# Altium integrated library BYTECH_HW_LIB_2019.IntLib: 907 symbols (part 1 of 6) (continued)
## ESP32-WROOM-32U (continued)
text: ONLY FOR; MEMORY

## ESP32-WROVER-B
designator U?
SMD MODULE ESP32-WROVER-B, ESP32; MFR: Espressif; Solder: SMT; Category: MODULE; MPN: ESP32-WROVER-B; PinCount: 39; Value: ESP32-WROVER-B
footprint ESP32-WROVER
pins: 1 GND (power) "Ground", 2 3V3 (power) "Power supply", 3 EN (in) "Module-enable signal. Active high.", 4 SENSOR_VP (in) "GPIO36, ADC1_CH0, RTC_GPIO0", 5 SENSOR_VN (in) "GPIO39, ADC1_CH3, RTC_GPIO3", 6 IO34 (in) "GPIO34, ADC1_CH6, RTC_GPIO4", 7 IO35 (in) "GPIO35, ADC1_CH7, RTC_GPIO5", 8 IO32 (io) "GPIO32, XTAL_32K_P, ADC1_CH4, TOUCH9, RTC_GPIO9", 9 IO33 (io) "GPIO33, XTAL_32K_N, ADC1_CH5,TOUCH8, RTC_GPIO8", 10 IO25 (io) "GPIO25, DAC_1, ADC2_CH8, RTC_GPIO6, EMAC_RXD0", 11 IO26 (io) "GPIO26, DAC_2, ADC2_CH9, RTC_GPIO7, EMAC_RXD1", 12 IO27 (io) "GPIO27, ADC2_CH7, TOUCH7, RTC_GPIO17, EMAC_RX_DV", 13 IO14 (io) "GPIO14, ADC2_CH6, TOUCH6, RTC_GPIO16, MTMS, HSPICLK, HS2_CLK, SD_CLK, EMAC_TXD2", 14 IO12 (io) "GPIO12, ADC2_CH5, TOUCH5, RTC_GPIO15, MTDI, HSPIQ, HS2_DATA2, SD_DATA2, EMAC_TXD3", 15 GND (power) "Ground", 16 IO13 (io) "GPIO13, ADC2_CH4, TOUCH4, RTC_GPIO14, MTCK, HSPID, HS2_DATA3,SD_DATA3, EMAC_RX_ER", 17 SHD/SD2* (io) "GPIO9, SD_DATA2, SPIHD, HS1_DATA2, U1RXD", 18 SWP/SD3* (io) "GPIO10, SD_DATA3, SPIWP, HS1_DATA3, U1TXD", 19 SCS/CMD* (io) "GPIO11, SD_CMD, SPICS0, HS1_CMD, U1RTS", 20 SCK/CLK* (io) "GPIO6, SD_CLK, SPICLK, HS1_CLK, U1CTS", 21 SDO/SD0* (io) "GPIO7, SD_DATA0, SPIQ, HS1_DATA0, U2RTS", 22 SDI/SD1* (io) "GPIO8, SD_DATA1, SPID, HS1_DATA1, U2CTS", 23 IO15 (io) "GPIO15, ADC2_CH3, TOUCH3, MTDO, HSPICS0, RTC_GPIO13, HS2_CMD,SD_CMD, EMAC_RXD3", 24 IO2 (io) "GPIO2, ADC2_CH2, TOUCH2, RTC_GPIO12, HSPIWP, HS2_DATA0,SD_DATA0", 25 IO0 (io) "GPIO0, ADC2_CH1, TOUCH1, RTC_GPIO11, CLK_OUT1, EMAC_TX_CLK", 26 IO4 (io) "GPIO4, ADC2_CH0, TOUCH0, RTC_GPIO10, HSPIHD, HS2_DATA1,SD_DATA1, EMAC_TX_ER", 27 NC "GPIO16, HS1_DATA4, U2RXD, EMAC_CLK_OUT", 28 NC "GPIO17, HS1_DATA5, U2TXD, EMAC_CLK_OUT_180", 29 IO5 (io) "GPIO5, VSPICS0, HS1_DATA6, EMAC_RX_CLK", 30 IO18 (io) "GPIO18, VSPICLK, HS1_DATA7", 31 IO19 (io) "GPIO19, VSPIQ, U0CTS, EMAC_TXD0", 32 NC, 33 IO21 (io) "GPIO21, VSPIHD, EMAC_TX_EN", 34 RXD0 (io) "GPIO3, U0RXD, CLK_OUT2", 35 TXD0 (io) "GPIO1, U0TXD, CLK_OUT3, EMAC_RXD2", 36 IO22 (io) "GPIO22, VSPIWP, U0RTS, EMAC_TXD1", 37 IO23 (io) "GPIO23, VSPID, HS1_STROBE", 38 GND (power) "Ground", 39 TP (power)
text: ONLY FOR; MEMORY

## ESP-01
designator M?
MFR: Espressif; MPN: ESP-01; Solder: WAVE; Value: ESP-01; Category: MODULE; PinCount: 8
footprint ESP-01&01S Module
pins: 1 RX, 2 IO0, 3 IO2, 4 GND, 5 VDD, 6 RST, 7 EN, 8 TX

## ESP-01M
designator M?
MFR: Espressif; MPN: ESP-01M; Solder: SMT; Value: ESP-01M; Category: MODULE; PinCount: 18
footprint ESP-01M
pins: 1 GND, 2 VDD, 3 TXD0, 4 RXD0, 5 GPIO13, 6 GPIO15, 7 GPIO2, 8 GPIO0, 9 EN, 10 GPIO4, 11 GPIO9, 12 GPIO10, 13 GPIO5, 14 GPIO12, 15 GPIO14, 16 ADC, 17 GPIO16, 18 RST

## ESP-01S
designator M?
MFR: Espressif; MPN: ESP-01S; Solder: WAVE; Value: ESP-01S; Category: MODULE; PinCount: 8
footprint ESP-01&01S Module
pins: 1 RX, 2 IO0, 3 IO2, 4 GND, 5 VDD, 6 RST, 7 EN, 8 TX

## ESP-07
designator M?
ESP-07 Module; MFR: Espressif; Solder: SMT; Category: MODULE; MPN: ESP-07; PinCount: 16; Value: ESP-07
footprint ESP-07 Module
pins: 1 RST, 2 ADC, 3 EN, 4 GPIO16, 5 GPIO14, 6 GPIO12, 7 GPIO13, 8 VCC, 9 GND, 10 GPIO15, 11 GPIO2, 12 GPIO0, 13 GPIO4, 14 GPIO5, 15 RXD0, 16 TXD0

## ESP-07S
designator M?
ESP-07S Module; MFR: Espressif; Solder: SMT; Category: MODULE; MPN: ESP-07S; PinCount: 16; Value: ESP-07S
footprint ESP-07S Module
pins: 0 GND, 1 RST, 2 ADC, 3 EN, 4 GPIO16, 5 GPIO14, 6 GPIO12, 7 GPIO13, 8 VCC, 9 GND, 10 GPIO15, 11 GPIO2, 12 GPIO0, 13 GPIO4, 14 GPIO5, 15 RXD0, 16 TXD0

## ESP-12E
designator M?
ESP-12E Module; MFR: Espressif; Solder: SMT; Category: MODULE; MPN: ESP-12E; PinCount: 22; Value: ESP-12E
footprint ESP-12E&F Module
pins: 1 RST, 2 ADC, 3 EN, 4 GPIO16, 5 GPIO14, 6 GPIO12, 7 GPIO13, 8 VCC, 9 CS0, 10 MISO, 11 GPIO9, 12 GPIO10, 13 MOSI, 14 SCLK, 15 GND, 16 GPIO15, 17 GPIO2, 18 GPIO0, 19 GPIO4, 20 GPIO5, 21 RXD0, 22 TXD0

## ESP-12F
designator M?
ESP-12F Module; MFR: Espressif; Solder: SMT; Category: MODULE; MPN: ESP-12F; PinCount: 22; Value: ESP-12F
footprint ESP-12E&F Module
pins: 1 RST, 2 ADC, 3 EN, 4 GPIO16, 5 GPIO14, 6 GPIO12, 7 GPIO13, 8 VCC, 9 CS0, 10 MISO, 11 GPIO9, 12 GPIO10, 13 MOSI, 14 SCLK, 15 GND, 16 GPIO15, 17 GPIO2, 18 GPIO0, 19 GPIO4, 20 GPIO5, 21 RXD0, 22 TXD0

## ESP-12S
designator U?
ESP-12S Module; MFR: Espressif; Solder: SMT; Category: MODULE; MPN: ESP-12S; PinCount: 16; Value: ESP-12S
footprint ESP-12S Module
pins: 0 GND, 1 RST, 2 ADC, 3 EN, 4 GPIO16, 5 GPIO14, 6 GPIO12, 7 GPIO13, 8 VCC, 9 GND, 10 GPIO15, 11 GPIO2, 12 GPIO0, 13 GPIO4, 14 GPIO5, 15 RXD0, 16 TXD0

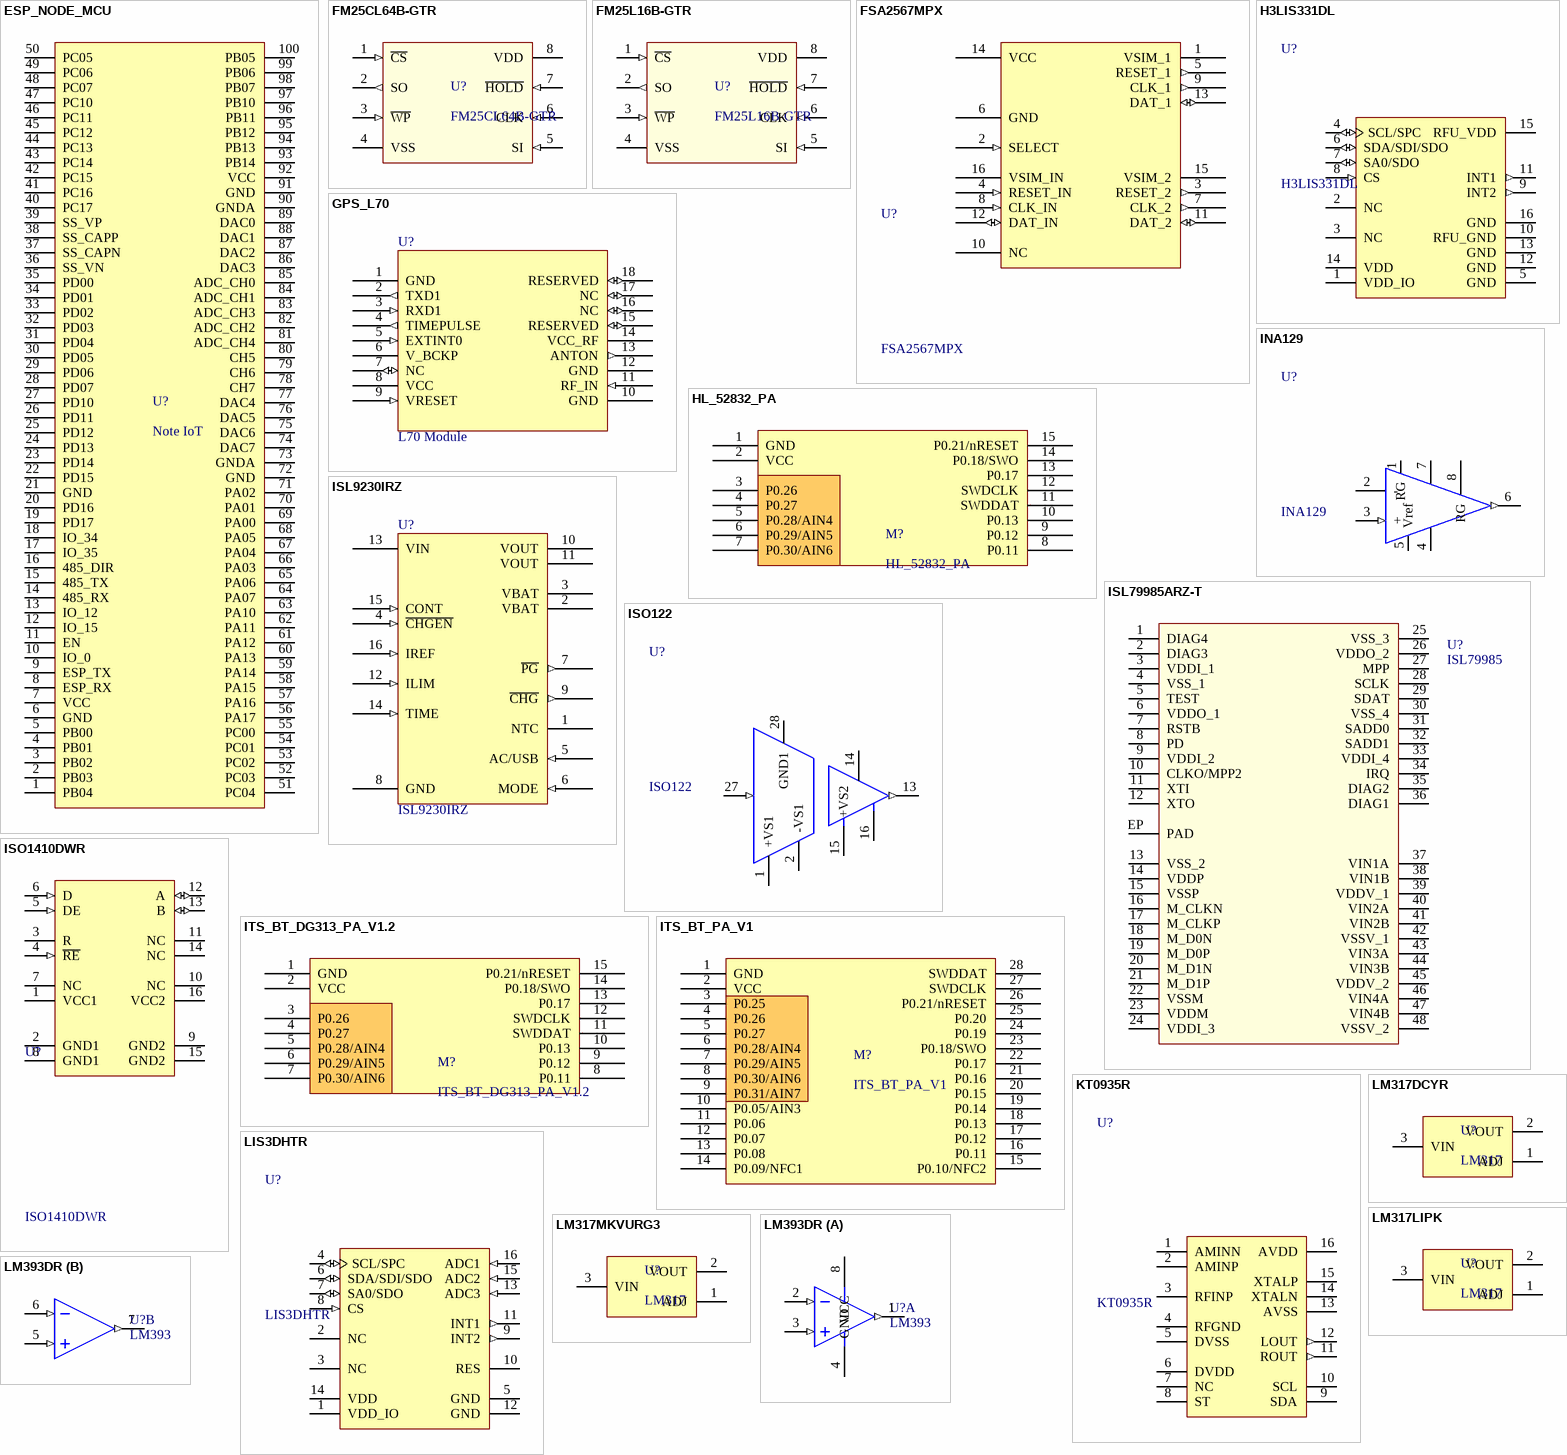
[diagram p4: symbols ESP_NODE_MCU to LM393DR]

## ESP_NODE_MCU
designator U?, comment Note IoT
PINOUT FOR NODE IOT; Project: TPA_IoT; Designer: Butpt; Value: Note IoT
footprint NODE_IOT
pins: 1 PB04, 2 PB03, 3 PB02, 4 PB01, 5 PB00, 6 GND, 7 VCC, 8 ESP_RX, 9 ESP_TX, 10 IO_0, 11 EN, 12 IO_15, 13 IO_12, 14 485_RX, 15 485_TX, 16 485_DIR, 17 IO_35, 18 IO_34, 19 PD17, 20 PD16, 21 GND, 22 PD15, 23 PD14, 24 PD13, 25 PD12, 26 PD11, 27 PD10, 28 PD07, 29 PD06, 30 PD05, 31 PD04, 32 PD03, 33 PD02, 34 PD01, 35 PD00, 36 SS_VN, 37 SS_CAPN, 38 SS_CAPP, 39 SS_VP, 40 PC17, 41 PC16, 42 PC15, 43 PC14, 44 PC13, 45 PC12, 46 PC11, 47 PC10, 48 PC07, 49 PC06, 50 PC05, 51 PC04, 52 PC03, 53 PC02, 54 PC01, 55 PC00, 56 PA17, 57 PA16, 58 PA15, 59 PA14, 60 PA13, 61 PA12, 62 PA11, 63 PA10, 64 PA07, 65 PA06, 66 PA03, 67 PA04, 68 PA05, 69 PA00, 70 PA01, 71 PA02, 72 GND, 73 GNDA, 74 DAC7, 75 DAC6, 76 DAC5, 77 DAC4, 78 CH7, 79 CH6, 80 CH5, 81 ADC_CH4, 82 ADC_CH2, 83 ADC_CH3, 84 ADC_CH1, 85 ADC_CH0, 86 DAC3, 87 DAC2, 88 DAC1, 89 DAC0, 90 GNDA, 91 GND, 92 VCC, 93 PB14, 94 PB13, 95 PB12, 96 PB11, 97 PB10, 98 PB07, 99 PB06, 100 PB05

## FM25CL64B-GTR
designator U?
IC FRAM 64KBIT 20MHz SOIC-8; Solder: SMT; MPN: FM25CL64B-GTR; Value: FM25CL64B-GTR; Category: IC; PinCount: 8
footprint SOIC-8
pins: 1 ~{CS} (in), 2 SO (out), 3 ~{WP} (in), 4 VSS (power), 5 SI (in), 6 CLK (in), 7 ~{HOLD} (in), 8 VDD (power)

## FM25L16B-GTR
designator U?
IC FRAM 16KBIT 20MHz SOIC-8; Solder: SMT; MPN: FM25L16B-GTR; Value: FM25L16B-GTR; Category: IC; PinCount: 8
footprint SOIC-8
pins: 1 ~{CS} (in), 2 SO (out), 3 ~{WP} (in), 4 VSS (power), 5 SI (in), 6 CLK (in), 7 ~{HOLD} (in), 8 VDD (power)

## FSA2567MPX
designator U?
IC SWITCH 4PDT 16MLP; MFR: ON Semiconductor; Solder: SMT; MPN: FSA2567MPX; Value: FSA2567MPX; Category: IC; PinCount: 16
footprint QFN16 30X30 (QFN, 16-Leads, Body 3.00x3.00mm, Pitch 0.50mm, Thermal Pad 1.70x1.70mm, IPC Medium Density)
pins: 1 VSIM_1 (power), 2 SELECT (in), 3 RESET_2 (out), 4 RESET_IN (in), 5 RESET_1 (out), 6 GND (power), 7 CLK_2 (out), 8 CLK_IN (in), 9 CLK_1 (out), 10 NC (hiz), 11 DAT_2 (io), 12 DAT_IN (io), 13 DAT_1 (io), 14 VCC (power), 15 VSIM_2 (power), 16 VSIM_IN (power)

## GPS_L70
designator U?, comment L70 Module
L70 GPS module; Solder: SMT; Value: L70B; MPN: L70B; Category: MODULE
footprint GPS.L70
pins: 1 GND (power), 2 TXD1 (out), 3 RXD1 (in), 4 TIMEPULSE (out), 5 EXTINT0 (in), 6 V_BCKP (power), 7 NC (io), 8 VCC (power), 9 VRESET (in), 10 GND (power), 11 RF_IN (in), 12 GND (power), 13 ANTON (out), 14 VCC_RF (power), 15 RESERVED (io), 16 NC (io), 17 NC (io), 18 RESERVED (io)

## H3LIS331DL
designator U?
ACCEL 100-400G I2C/SPI 16TFLGA; MFR: STMicroelectronics; Solder: SMT; MPN: H3LIS331DL; Value: H3LIS331DL; Category: IC; PinCount: 16
footprint STM-LGA-16_N (Footprint not found)
pins: 1 VDD_IO (power) "Power supply for I/O pins", 2 NC "Not connected", 3 NC "Not connected", 4 SCL/SPC (io) "I2C serial clock (SCL),SPI serial port clock (SPC)", 5 GND (power) "0V supply", 6 SDA/SDI/SDO (io) "I2C serial data (SDA),SPI serial data input (SDI),3-wire interface serial data output (SDO)", 7 SA0/SDO (io) "SPI serial data output (SDO),I2C less significant bit of the device address (SA0)", 8 CS (in) "SPI enable I2C/SPI mode selection (1: I2C mode; 0: SPI enabled)", 9 INT2 (out) "Inertial interrupt 2", 10 RFU_GND (power) "Connect to GND", 11 INT1 (out) "Inertial interrupt 1", 12 GND (power) "0 V supply", 13 GND (power) "Analog to digital converter input 3", 14 VDD (power) "Power supply", 15 RFU_VDD (power), 16 GND (power) "Analog to digital converter input 1"

## HL_52832_PA
designator M?
Solder: SMT; MPN: HL_52832_PA; Value: HL_52832_PA; Category: MODULE
footprint HL_52832_PA
pins: 1 GND, 2 VCC, 3 P0.26, 4 P0.27, 5 P0.28/AIN4, 6 P0.29/AIN5, 7 P0.30/AIN6, 8 P0.11, 9 P0.12, 10 P0.13, 11 SWDDAT, 12 SWDCLK, 13 P0.17, 14 P0.18/SWO, 15 P0.21/nRESET

## INA129
designator U?
IC INST AMP 1 CIRCUIT 8SOIC; MPN: INA129UA/2K5; MFR: TI; Solder: SMT; Value: INA129; Category: IC; PinCount: 8
footprint SOIC-8
pins: 1 RG, 2 -, 3 + (in), 4 V-, 5 Vref, 6 Vout (out), 7 V+, 8 RG

## ISL9230IRZ
designator U?
IC BATT CHRGR LIION 1CELL 16TQFN; Solder: SMT; MPN: ISL9230IRZ; Value: ISL9230IRZ; Category: IC
footprint VFQFN-16 (16-VFQFN Exposed Pad)
pins: 1 NTC, 2 VBAT (power), 3 VBAT (power), 4 ~{CHGEN} (in), 5 AC/USB (in), 6 MODE (in), 7 ~{PG} (out), 8 GND (power), 9 ~{CHG} (out), 10 VOUT (power), 11 VOUT (power), 12 ILIM (in), 13 VIN (power), 14 TIME (in), 15 CONT (in), 16 IREF (in)

## ISL79985ARZ-T
designator U?, comment ISL79985
ISL79985 AUTO GRADE 4CH ANALOG; MPN: ISL79985ARZ-T; Solder: SMT; CPN: *; Value: ISL79985; Category: IC
pins: 1 DIAG4, 2 DIAG3, 3 VDDI_1, 4 VSS_1, 5 TEST, 6 VDDO_1, 7 RSTB, 8 PD, 9 VDDI_2, 10 CLKO/MPP2, 11 XTI, 12 XTO, 13 VSS_2, 14 VDDP, 15 VSSP, 16 M_CLKN, 17 M_CLKP, 18 M_D0N, 19 M_D0P, 20 M_D1N, 21 M_D1P, 22 VSSM, 23 VDDM, 24 VDDI_3, 25 VSS_3, 26 VDDO_2, 27 MPP, 28 SCLK, 29 SDAT, 30 VSS_4, 31 SADD0, 32 SADD1, 33 VDDI_4, 34 IRQ, 35 DIAG2, 36 DIAG1, 37 VIN1A, 38 VIN1B, 39 VDDV_1, 40 VIN2A, 41 VIN2B, 42 VSSV_1, 43 VIN3A, 44 VIN3B, 45 VDDV_2, 46 VIN4A, 47 VIN4B, 48 VSSV_2, EP PAD

## ISO122
designator U?
IC OPAMP ISOLATION 1 CIRC 8SOIC; MPN: ISO122JU/1K; MFR: TI; Solder: SMT; Value: ISO122; Category: IC; PinCount: 8
footprint ISO122 (SOT23, 3-Leads, Body 2,90x2,30mm, Pitch 0,95mm, IPC Medium Density)
pins: 1 +VS1 (power), 2 -VS1 (power), 13 OUT (out), 14 GND2 (power), 15 +VS2 (power), 16 -VS2 (power), 27 IN (in), 28 GND1 (power)

## ISO1410DWR
designator U?
IC TRANSCEIVER HALF 1/1 16SOIC; Solder: SMT; MPN: ISO1410DWR; Value: ISO1410DWR; Category: IC
footprint DW16_N (SOIC, 16-Leads, Body 10.3x7.5mm, Pitch 1.27mm, IPC Medium Density)
pins: 1 VCC1 (power), 2 GND1 (power), 3 R (hiz), 4 ~{RE} (in), 5 DE (in), 6 D (in), 7 NC (power), 8 GND1 (power), 9 GND2 (power), 10 NC (power), 11 NC, 12 A (io), 13 B (io), 14 NC, 15 GND2 (power), 16 VCC2 (power)

## ITS_BT_DG313_PA_V1.2
designator M?
MFR: BY TECH JSC; Solder: SMT; MPN: ITS_BT_DG313_PA_V1.2; Value: ITS_BT_DG313_PA_V1.2; Category: MODULE; PinCount: 15
footprint ITS_BT_DG313_PA_V1.2 (Footprint not found)
pins: 1 GND, 2 VCC, 3 P0.26, 4 P0.27, 5 P0.28/AIN4, 6 P0.29/AIN5, 7 P0.30/AIN6, 8 P0.11, 9 P0.12, 10 P0.13, 11 SWDDAT, 12 SWDCLK, 13 P0.17, 14 P0.18/SWO, 15 P0.21/nRESET

## ITS_BT_PA_V1
designator M?
Solder: SMT; MPN: ITS_BT_PA_V1; Value: ITS_BT_PA_V1; Category: MODULE
footprint ITS-BT-PA-V1
pins: 1 GND, 2 VCC, 3 P0.25, 4 P0.26, 5 P0.27, 6 P0.28/AIN4, 7 P0.29/AIN5, 8 P0.30/AIN6, 9 P0.31/AIN7, 10 P0.05/AIN3, 11 P0.06, 12 P0.07, 13 P0.08, 14 P0.09/NFC1, 15 P0.10/NFC2, 16 P0.11, 17 P0.12, 18 P0.13, 19 P0.14, 20 P0.15, 21 P0.16, 22 P0.17, 23 P0.18/SWO, 24 P0.19, 25 P0.20, 26 P0.21/nRESET, 27 SWDCLK, 28 SWDDAT

## KT0935R
designator U?
RF RX AM/FM RECEIVER; Solder: SMT; Value: KT0935R; MPN: KT0935R; Category: IC
footprint KT0935R (Small Outline IC (SOIC), 1.27 mm pitch; 16 pin, 9.90 mm L X 4.00 mm W X 1.75 mm H body)
pins: 1 AMINN, 2 AMINP, 3 RFINP, 4 RFGND, 5 DVSS, 6 DVDD, 7 NC, 8 ST, 9 SDA, 10 SCL, 11 ROUT (out), 12 LOUT (out), 13 AVSS, 14 XTALN, 15 XTALP, 16 AVDD

## LIS3DHTR
designator U?
ACCEL 2-16G I2C/SPI 16LGA; MFR: STMicroelectronics; Solder: SMT; MPN: LIS3DHTR; Value: LIS3DHTR; Category: IC; PinCount: 16
footprint STM-LGA-16_N (Footprint not found)
pins: 1 VDD_IO (power) "Power supply for I/O pins", 2 NC "Not connected", 3 NC "Not connected", 4 SCL/SPC (io) "I2C serial clock (SCL),SPI serial port clock (SPC)", 5 GND (power) "0V supply", 6 SDA/SDI/SDO (io) "I2C serial data (SDA),SPI serial data input (SDI),3-wire interface serial data output (SDO)", 7 SA0/SDO (io) "SPI serial data output (SDO),I2C less significant bit of the device address (SA0)", 8 CS (in) "SPI enable I2C/SPI mode selection (1: I2C mode; 0: SPI enabled)", 9 INT2 (out) "Inertial interrupt 2", 10 RES (power) "Connect to GND", 11 INT1 (out) "Inertial interrupt 1", 12 GND (power) "0 V supply", 13 ADC3 (in) "Analog to digital converter input 3", 14 VDD (power) "Power supply", 15 ADC2 (in) "Analog to digital converter input 2", 16 ADC1 (in) "Analog to digital converter input 1"

## LM317DCYR
designator U?, comment LM317
IC REG LIN POS ADJ 1.5A SOT223-4; MPN: LM317DCYR; Solder: SMT; Value: LM317; Category: IC
footprint SOT-223-4
pins: 1 ADJ, 2 VOUT, 3 VIN

## LM317LIPK
designator U?, comment LM317
IC REG LIN POS ADJ 100MA SOT89-3; MPN: LM317LIPK; Solder: SMT; Value: LM317; Category: IC
footprint SOT89-150P350X160-3M (SOT89, 3-Leads, Body 4.50x2.50mm, Pitch 1.50mm, Lead Span 3.5mm, IPC Low Density)
pins: 1 ADJ, 2 VOUT, 3 VIN

## LM317MKVURG3
designator U?, comment LM317
IC REG LIN POS ADJ 500MA TO252-3; MPN: LM317MKVURG3; Solder: SMT; Value: LM317; Category: IC
footprint TO-252-3
pins: 1 ADJ, 2 VOUT, 3 VIN

## LM393DR
designator U?, comment LM393
IC DUAL DIFF COMP 8-SOIC; MPN: LM393DR; Solder: SMT; Value: LM393; Category: IC
footprint SOIC-8
part A pins: 1 OUT (out), 2 IN- (in), 3 IN+ (in), 4 GND (power), 8 VCC (power)
part B pins: 5 IN+ (in), 6 IN- (in), 7 OUT (out)

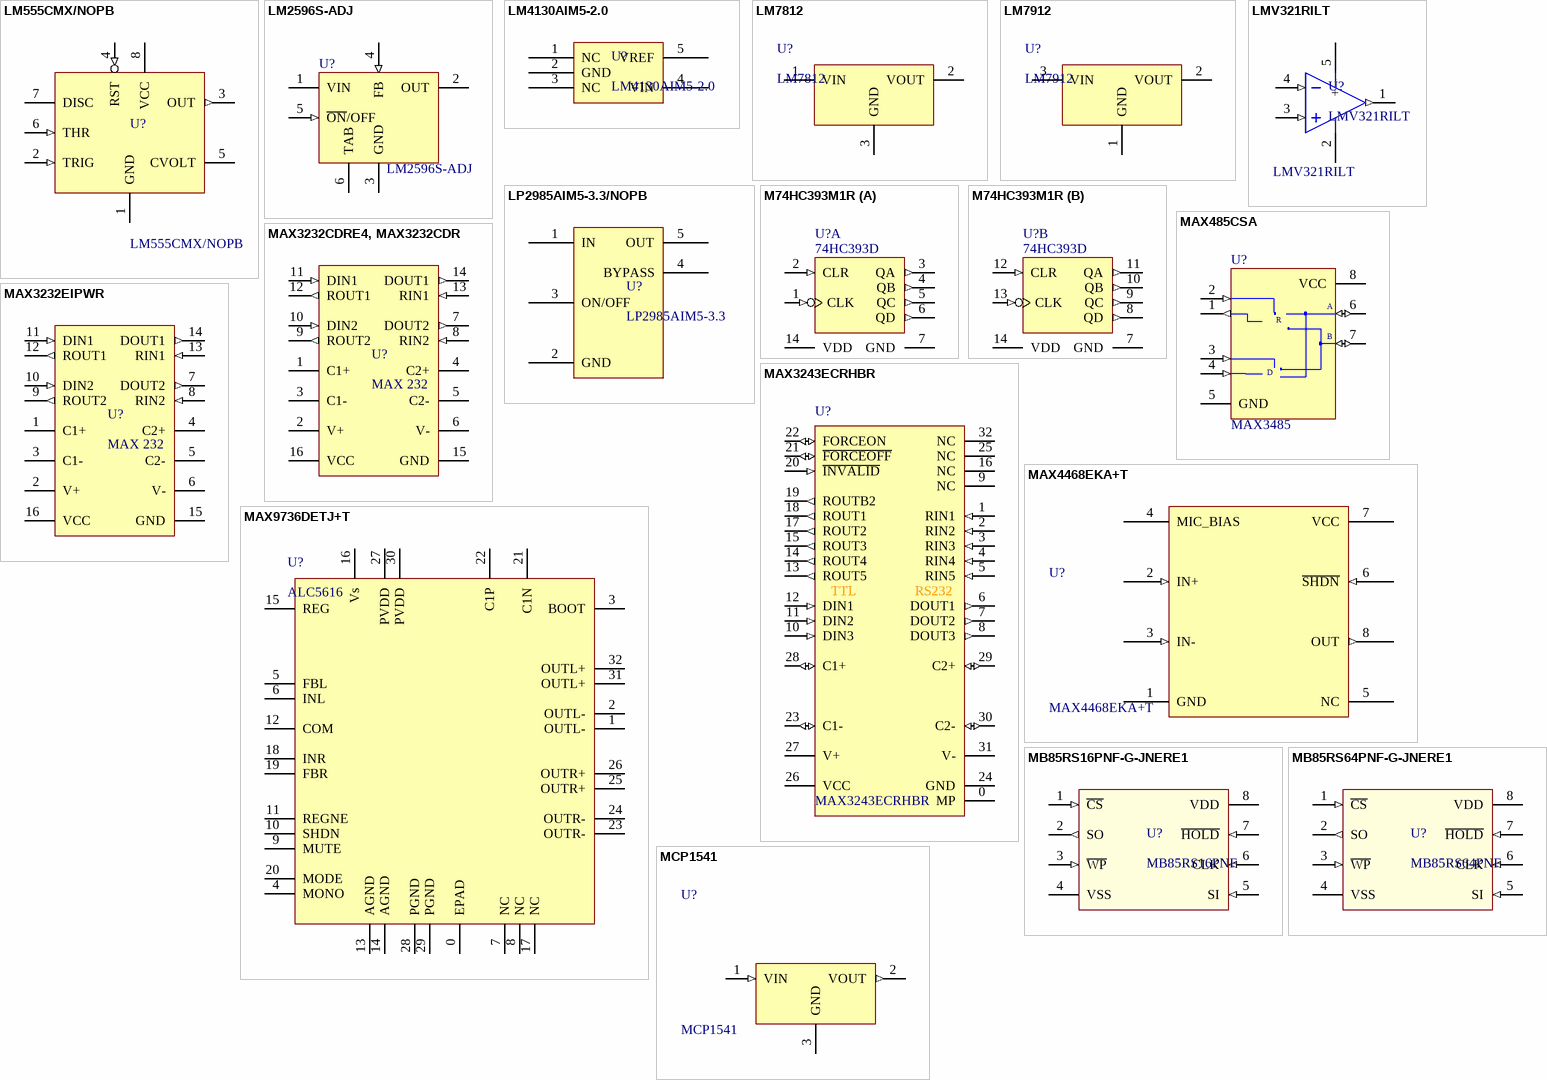
[diagram p5: symbols LM555CMX/NOPB to MCP1541]

## LM555CMX/NOPB
designator U?
IC OSC SGL TIMER 100KHZ 8-SOIC; Solder: SMT; MPN: LM555CMX/NOPB; Value: LM555CMX/NOPB; Category: IC
footprint SOIC-8
pins: 1 GND (power), 2 TRIG (in), 3 OUT (out), 4 RST (in), 5 CVOLT, 6 THR (in), 7 DISC (oc), 8 VCC (power)

## LM2596S-ADJ
designator U?
SIMPLE SWITCHER Power Converter 150 KHz 3A Step-Down Voltage Regulator; MPN: LM2596SX-ADJ/NOPB; Solder: SMT; Value: LM2596S-ADJ; Category: IC
footprint TS5B_L (D2-PAK, 6-Leads, Body 8.6x10.2mm, Pitch 1.7mm, Lead Span 14.1mm, IPC High Density)
footprint TS5B_M (D2-PAK, 6-Leads, Body 8.6x10.2mm, Pitch 1.7mm, Lead Span 14.1mm, IPC Low Density)
footprint TS5B_M (D2-PAK, 6-Leads, Body 8.6x10.2mm, Pitch 1.7mm, Lead Span 14.1mm, IPC Low Density)
footprint TO263-5 (LM2576-SMD)
pins: 1 VIN (power), 2 OUT (power), 3 GND (power), 4 FB (in), 5 ~{ON}/OFF (in), 6 TAB (power)

## LM4130AIM5-2.0
designator U?
Solder: SMT; MPN: LM4130AIM5-2.0; Value: LM4130AIM5-2.0; Category: IC
footprint SOT23-5
pins: 1 NC, 2 GND, 3 NC, 4 VIN, 5 VREF

## LM7812
designator U?
IC REG LINEAR 12V 1.5A D2PAK; MPN: L7812CD2T-TR; MFR: STM; Solder: SMT; Value: LM7812; Category: IC; PinCount: 3
footprint TO263_3 (DPAK, 5.08 mm pitch; 2 pin, 9.08 mm L X 10.16 mm W X 4.80 mm H body)
pins: 1 VIN, 2 VOUT, 3 GND

## LM7912
designator U?
IC REG LINEAR -12V 1.5A D2PAK; MPN: L7912CD2T-TR; MFR: STM; Solder: SMT; Value: LM7912; Category: IC; PinCount: 3
footprint TO263_3 (DPAK, 5.08 mm pitch; 2 pin, 9.08 mm L X 10.16 mm W X 4.80 mm H body)
pins: 1 GND, 2 VOUT, 3 VIN

## LMV321RILT
designator U?
IC OPAMP GP 1.3MHz RRO SOT23-5; Solder: SMT; MPN: LMV321RILT; Category: IC; Value: LMV321RILT
footprint SOT23-5
pins: 1 OUT (out), 2 VDD (power), 3 IN+ (in), 4 IN- (in), 5 + (power)

## LP2985AIM5-3.3/NOPB
designator U?, comment LP2985AIM5-3.3
IC REG LINEAR 3.3V 150MA SOT23-5; MPN: LP2985AIM5-3.3/NOPB; MFR: Texas Instruments; Solder: SMT; Value: LP2985AIM5-3.3; Category: IC
footprint SOT23-5
pins: 1 IN, 2 GND, 3 ON/OFF, 4 BYPASS, 5 OUT

## M74HC393M1R
designator U?, comment 74HC393D
Dual Binary Counter; MPN: 74HC393D,653; Solder: SMT; Value: 74HC393D; Category: IC
footprint SOIC-14 (Small Outline IC (SOIC), 1.27 mm pitch; 14 pin, 8.65 mm L X 3.90 mm W X 1.75 mm H body)
pins on every part: 7 GND (power) hidden to GND, 14 VDD (power) hidden to VDD
part A pins: 1 CLK (in), 2 CLR (in), 3 QA (out), 4 QB (out), 5 QC (out), 6 QD (out)
part B pins: 8 QD (out), 9 QC (out), 10 QB (out), 11 QA (out), 12 CLR (in), 13 CLK (in)

## MAX485CSA
designator U?, comment MAX3485
Low-Power, Slew-Rate-Limited RS-485/RS-422 Transceiver; MPN: MAX3485ESA; Value: MAX485; Solder: SMT; Category: IC
footprint SOIC-8
pins: 1 RO (out), 2 ~{RE} (in), 3 DE (in), 4 DI (in), 5 GND (power), 6 A (io), 7 B (io), 8 VCC (power)
text: R; D

## MAX3232CDRE4, MAX3232CDR
designator U?, comment MAX 232
IC DRVR/RCVR MULTCH RS232 16SOIC; MPN: MAX3232CDRE4, MAX3232CDR; Solder: SMT; Value: MAX 232; Category: IC
footprint SOIC-16 (Small Outline IC (SOIC), 1.27 mm pitch; 16 pin, 9.90 mm L X 4.00 mm W X 1.75 mm H body)
pins: 1 C1+, 2 V+ (power), 3 C1-, 4 C2+, 5 C2-, 6 V- (power), 7 DOUT2 (out), 8 RIN2 (in), 9 ROUT2 (out), 10 DIN2 (in), 11 DIN1 (in), 12 ROUT1 (out), 13 RIN1 (in), 14 DOUT1 (out), 15 GND (power), 16 VCC (power)

## MAX3232EIPWR
designator U?, comment MAX 232
IC RS232 LINE DVR/RCVR 16TSSOP; MPN: MAX3232EIPWR; Solder: SMT; Value: MAX 232; Category: IC
footprint TI-PW16_N (TSOP, 16-Leads, Body 5x4.4mm, Pitch 0.65mm, IPC Medium Density)
pins: 1 C1+, 2 V+ (power), 3 C1-, 4 C2+, 5 C2-, 6 V- (power), 7 DOUT2 (out), 8 RIN2 (in), 9 ROUT2 (out), 10 DIN2 (in), 11 DIN1 (in), 12 ROUT1 (out), 13 RIN1 (in), 14 DOUT1 (out), 15 GND (power), 16 VCC (power)

## MAX3243ECRHBR
designator U?
IC TRANSCEIVER FULL 3/5 32FN; MF: Maxim Integrated; MP: MAX3243EEUI+; Package: TSSOP-28 Maxim; Price: None; Availability: Unavailable; SnapEDA_Link: https://www.snapeda.com/parts/MAX3243EEUI%2B/Maxim%20Integrated/view-part/991547/?ref=snap; Value: *
footprint QFN50P500X500X100-33N
pins: 0 MP, 1 RIN1 (in), 2 RIN2 (in), 3 RIN3 (in), 4 RIN4 (in), 5 RIN5 (in), 6 DOUT1 (out), 7 DOUT2 (out), 8 DOUT3 (out), 9 NC, 10 DIN3 (in), 11 DIN2 (in), 12 DIN1 (in), 13 ROUT5 (out), 14 ROUT4 (out), 15 ROUT3 (out), 16 NC, 17 ROUT2 (out), 18 ROUT1 (out), 19 ROUTB2 (out), 20 ~{INVALID} (in), 21 ~{FORCEOFF} (io), 22 FORCEON (io), 23 C1- (io), 24 GND (power), 25 NC, 26 VCC (power), 27 V+ (power), 28 C1+ (io), 29 C2+ (io), 30 C2- (io), 31 V- (power), 32 NC
text: TTL; RS232

## MAX4468EKA+T
designator U?
IC AMP CLASS AB MONO SOT23-8; MFR: Maxim Integrated; Solder: SMT; MPN: MAX4468EKA+T; Value: MAX4468EKA+T; Category: IC; PinCount: 14
footprint SOT23-8_0.65MM
pins: 1 GND (power), 2 IN+ (in), 3 IN- (in), 4 MIC_BIAS (power), 5 NC (hiz), 6 ~{SHDN} (in), 7 VCC (power), 8 OUT (out)

## MAX9736DETJ+T
designator U?, comment ALC5616
IC AMP D MONO/STEREO 17MW 32TQFN; MFR: Maxim; MPN: MAX9736DETJ+T; Solder: SMT; PinCount: 33
footprint VFQFN-32 (32-VFQFN Exposed Pad)
pins: 0 EPAD, 1 OUTL-, 2 OUTL-, 3 BOOT, 4 MONO, 5 FBL, 6 INL, 7 NC, 8 NC, 9 MUTE, 10 SHDN, 11 REGNE, 12 COM, 13 AGND, 14 AGND, 15 REG, 16 Vs, 17 NC, 18 INR, 19 FBR, 20 MODE, 21 C1N, 22 C1P, 23 OUTR-, 24 OUTR-, 25 OUTR+, 26 OUTR+, 27 PVDD, 28 PGND, 29 PGND, 30 PVDD, 31 OUTL+, 32 OUTL+

## MB85RS16PNF-G-JNERE1
designator U?, comment MB85RS16PNF
IC FRAM 16K SPI 20MHZ 8SOP; MPN: MB85RS16PNF-G-JNERE1; MFR: Fujitsu Electronics America, Inc.; Solder: SMT; Value: MB85RS16PNF; Category: IC; PinCount: 8
footprint SOIC-8
pins: 1 ~{CS} (in), 2 SO (out), 3 ~{WP} (in), 4 VSS (power), 5 SI (in), 6 CLK (in), 7 ~{HOLD} (in), 8 VDD (power)

## MB85RS64PNF-G-JNERE1
designator U?, comment MB85RS64PNF
IC FRAM 64K SPI 20MHZ 8SOP; MPN: MB85RS64PNF-G-JNERE1; MFR: Fujitsu Electronics America, Inc.; Solder: SMT; Value: MB85RS64PNF; Category: IC; PinCount: 8
footprint SOIC-8
pins: 1 ~{CS} (in), 2 SO (out), 3 ~{WP} (in), 4 VSS (power), 5 SI (in), 6 CLK (in), 7 ~{HOLD} (in), 8 VDD (power)

## MCP1541
designator U?
IC VREF SERIES 1% SOT23-3; MPN: MCP1541T-I/TT; MFR: Microchip Technology; Solder: SMT; Value: MCP1541; Category: IC; PinCount: 3
footprint SOT23_3 (SOT23, 3-Leads, Body 2,90x2,30mm, Pitch 0,95mm, IPC Medium Density)
pins: 1 VIN (in), 2 VOUT (out), 3 GND

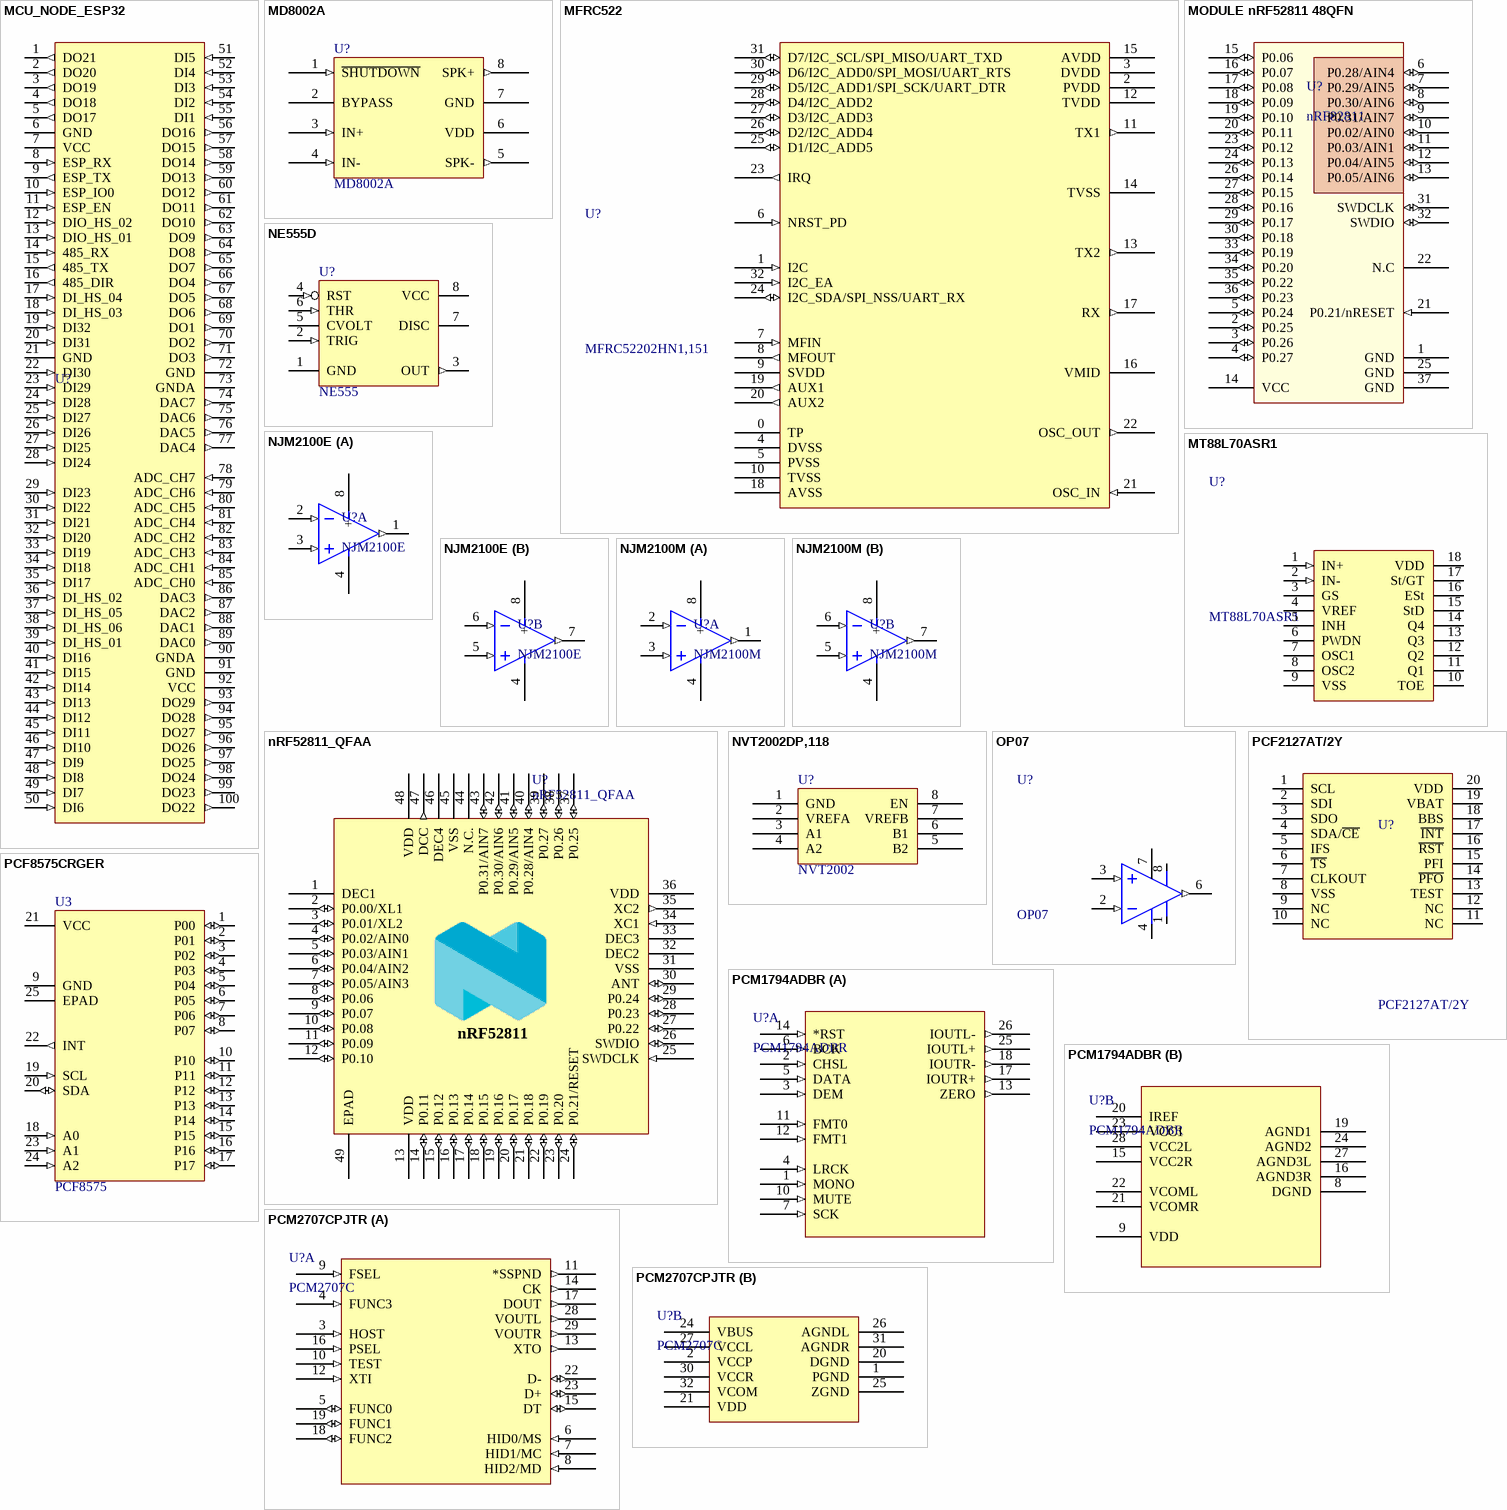
[diagram p6: symbols MCU_NODE_ESP32 to PCM2707CPJTR]

## MCU_NODE_ESP32
designator U?
MPN: MCU_NODE_ESP32; MFR: BY TECH; Solder: SMT; Category: IC
footprint ESP_NODE_MCU
pins: 1 DO21 (out), 2 DO20 (out), 3 DO19 (out), 4 DO18 (out), 5 DO17 (out), 6 GND, 7 VCC, 8 ESP_RX (in), 9 ESP_TX (out), 10 ESP_IO0 (in), 11 ESP_EN (in), 12 DIO_HS_02 (in), 13 DIO_HS_01 (in), 14 485_RX (in), 15 485_TX (out), 16 485_DIR (out), 17 DI_HS_04 (in), 18 DI_HS_03 (in), 19 DI32 (in), 20 DI31 (in), 21 GND, 22 DI30 (in), 23 DI29 (in), 24 DI28 (in), 25 DI27 (in), 26 DI26 (in), 27 DI25 (in), 28 DI24 (in), 29 DI23 (in), 30 DI22 (in), 31 DI21 (in), 32 DI20 (in), 33 DI19 (in), 34 DI18 (in), 35 DI17 (in), 36 DI_HS_02 (in), 37 DI_HS_05 (in), 38 DI_HS_06 (in), 39 DI_HS_01 (in), 40 DI16 (in), 41 DI15 (in), 42 DI14 (in), 43 DI13 (in), 44 DI12 (in), 45 DI11 (in), 46 DI10 (in), 47 DI9 (in), 48 DI8 (in), 49 DI7 (in), 50 DI6 (in), 51 DI5 (in), 52 DI4 (in), 53 DI3 (in), 54 DI2 (in), 55 DI1 (in), 56 DO16 (out), 57 DO15 (out), 58 DO14 (out), 59 DO13 (out), 60 DO12 (out), 61 DO11 (out), 62 DO10 (out), 63 DO9 (out), 64 DO8 (out), 65 DO7 (out), 66 DO4 (out), 67 DO5 (out), 68 DO6 (out), 69 DO1 (out), 70 DO2 (out), 71 DO3 (out), 72 GND, 73 GNDA, 74 DAC7 (out), 75 DAC6 (out), 76 DAC5 (out), 77 DAC4 (out), 78 ADC_CH7 (in), 79 ADC_CH6 (in), 80 ADC_CH5 (in), 81 ADC_CH4 (in), 82 ADC_CH2 (in), 83 ADC_CH3 (in), 84 ADC_CH1 (in), 85 ADC_CH0 (in), 86 DAC3 (out), 87 DAC2 (out), 88 DAC1 (out), 89 DAC0 (out), 90 GNDA, 91 GND, 92 VCC, 93 DO29 (out), 94 DO28 (out), 95 DO27 (out), 96 DO26 (out), 97 DO25 (out), 98 DO24 (out), 99 DO23 (out), 100 DO22 (out)

## MD8002A
designator U?
3W Audio Amplifier; Solder: SMT; MPN: MD8002A; Value: MD8002A; Category: IC; PinCount: 8
footprint SOIC-8
pins: 1 ~{SHUTDOWN} (in), 2 BYPASS (power), 3 IN+ (in), 4 IN- (in), 5 SPK- (out), 6 VDD (power), 7 GND (power), 8 SPK+ (out)

## MFRC522
designator U?, comment MFRC52202HN1,151
IC RFID READER 13.56MHZ 32HVQFN; MFR: NXP USA Inc.; Solder: SMT; MPN: MFRC52202HN1,151; Value: MFRC52202HN1,151; Category: IC; PinCount: 8
footprint VFQFN-32 (32-VFQFN Exposed Pad)
pins: 0 TP (power), 1 I2C (in), 2 PVDD (power), 3 DVDD (power), 4 DVSS (power), 5 PVSS (power), 6 NRST_PD (in), 7 MFIN (in), 8 MFOUT (out), 9 SVDD (power), 10 TVSS (power), 11 TX1 (out), 12 TVDD (power), 13 TX2 (out), 14 TVSS (power), 15 AVDD (power), 16 VMID (power), 17 RX (out), 18 AVSS (power), 19 AUX1 (out), 20 AUX2 (out), 21 OSC_IN (in), 22 OSC_OUT (out), 23 IRQ (out), 24 I2C_SDA/SPI_NSS/UART_RX (io), 25 D1/I2C_ADD5 (io), 26 D2/I2C_ADD4 (io), 27 D3/I2C_ADD3 (io), 28 D4/I2C_ADD2 (io), 29 D5/I2C_ADD1/SPI_SCK/UART_DTR (io), 30 D6/I2C_ADD0/SPI_MOSI/UART_RTS (io), 31 D7/I2C_SCL/SPI_MISO/UART_TXD (io), 32 I2C_EA (in)

## MODULE nRF52811 48QFN
designator U?, comment nRF82811
MPN: nRF52811 Module; Value: nRF82811
footprint BLE MODULE 52811
pins: 1 GND (power), 2 P0.25 (io), 3 P0.26 (io), 4 P0.27 (io), 5 P0.24 (io), 6 P0.28/AIN4 (io), 7 P0.29/AIN5 (io), 8 P0.30/AIN6 (io), 9 P0.31/AIN7 (io), 10 P0.02/AIN0 (io), 11 P0.03/AIN1 (io), 12 P0.04/AIN5 (io), 13 P0.05/AIN6 (io), 14 VCC (power), 15 P0.06 (io), 16 P0.07 (io), 17 P0.08 (io), 18 P0.09 (io), 19 P0.10 (io), 20 P0.11 (io), 21 P0.21/nRESET (in), 22 N.C, 23 P0.12 (io), 24 P0.13 (io), 25 GND (power), 26 P0.14 (io), 27 P0.15 (io), 28 P0.16 (io), 29 P0.17 (io), 30 P0.18 (io), 31 SWDCLK (io), 32 SWDIO (io), 33 P0.19 (io), 34 P0.20 (io), 35 P0.22 (io), 36 P0.23 (io), 37 GND (power)

## MT88L70ASR1
designator U?
IC TELECOM INTERFACE 18SOIC; MFR: Microchip Technology; Solder: SMT; MPN: MT88L70ASR1; Value: MT88L70ASR1; Category: IC; PinCount: 18
footprint SOIC-18 (SOIC, 18-Leads, Body 11.5x7.5mm, Pitch 1.27mm, IPC Low Density)
pins: 1 IN+ (in), 2 IN- (in), 3 GS, 4 VREF, 5 INH, 6 PWDN, 7 OSC1, 8 OSC2, 9 VSS, 10 TOE, 11 Q1, 12 Q2, 13 Q3, 14 Q4, 15 StD, 16 ESt, 17 St/GT, 18 VDD

## NE555D
designator U?, comment NE555
General-Purpose Single Bipolar Timer; MPN: LM555CMX/NOPB; Solder: SMT; Value: NE555; Category: IC
footprint SOIC8 (OPA2333)
pins: 1 GND (power), 2 TRIG (in), 3 OUT (out), 4 RST (in), 5 CVOLT, 6 THR (in), 7 DISC (oc), 8 VCC (power)

## NJM2100E
designator U?
DUAL OPERATIONAL AMPLIFIER; MFR: New Japan Radio; Solder: SMT; MPN: NJM2100E; Category: IC; Value: NJM2100E
footprint SOIC-8
part A pins: 1 OUT (out), 2 IN- (in), 3 IN+ (in), 4 VEE (power), 8 + (power)
part B pins: 4 VEE (power), 5 IN+ (in), 6 IN- (in), 7 OUT (out), 8 + (power)

## NJM2100M
designator U?
DUAL OPERATIONAL AMPLIFIER; MFR: New Japan Radio; Solder: SMT; MPN: NJM2100M; Category: IC; Value: NJM2100M
footprint DMP8 (TSOP, 8-Leads, Body 5.00x5.00mm, Pitch 1.27mm, IPC Medium Density)
part A pins: 1 OUT (out), 2 IN- (in), 3 IN+ (in), 4 VEE (power), 8 + (power)
part B pins: 4 VEE (power), 5 IN+ (in), 6 IN- (in), 7 OUT (out), 8 + (power)

## nRF52811_QFAA
designator U?
Multi-protocol Bluetooth Low Energy, ANT and 2.4GHz proprietary system-on-chip; MFR: Nordic Semiconductor; MPN: nRF52811_QFAA
footprint 48-VFQFN (VFQFN, 48-lead, Body 6x6 mm, 0.5 mm pitch,IPC High Density)
pins: 1 DEC1 (power), 2 P0.00/XL1 (io), 3 P0.01/XL2 (io), 4 P0.02/AIN0 (io), 5 P0.03/AIN1 (io), 6 P0.04/AIN2 (io), 7 P0.05/AIN3 (io), 8 P0.06 (io), 9 P0.07 (io), 10 P0.08 (io), 11 P0.09 (io), 12 P0.10 (io), 13 VDD (power), 14 P0.11 (io), 15 P0.12 (io), 16 P0.13 (io), 17 P0.14 (io), 18 P0.15 (io), 19 P0.16 (io), 20 P0.17 (io), 21 P0.18 (io), 22 P0.19 (io), 23 P0.20 (io), 24 P0.21/RESET (io), 25 SWDCLK (in), 26 SWDIO (io), 27 P0.22 (io), 28 P0.23 (io), 29 P0.24 (io), 30 ANT (io), 31 VSS (power), 32 DEC2 (power), 33 DEC3 (power), 34 XC1 (in), 35 XC2 (out), 36 VDD (power), 37 P0.25 (io), 38 P0.26 (io), 39 P0.27 (io), 40 P0.28/AIN4 (io), 41 P0.29/AIN5 (io), 42 P0.30/AIN6 (io), 43 P0.31/AIN7 (io), 44 N.C. (power), 45 VSS (power), 46 DEC4 (power), 47 DCC (out), 48 VDD (power), 49 (power) hidden to GND, 49 EPAD (power)
text: nRF52811

## NVT2002DP,118
designator U?, comment NVT2002
IC TRANSLATOR DUAL 8TSSOP; MPN: NVT2002DP,118; Solder: SMT; Value: NVT2002; Category: IC
footprint TSOP65P490X110-8N (TSOP, 8-Leads, Body 3.00x2.90mm, Pitch 0.65mm, IPC Medium Density)
pins: 1 GND, 2 VREFA, 3 A1, 4 A2, 5 B2, 6 B1, 7 VREFB, 8 EN

## OP07
designator U?
IC OPAMP GP 1 CIRCUIT 8SOIC; MPN: OP07CDR; MFR: TI; Solder: SMT; Value: OP07; Category: IC; PinCount: 8
footprint SOIC-8
pins: 1 Vos, 2 IN- (in), 3 IN+ (in), 4 -V, 6 OUT (out), 7 +V, 8 Vos

## PCF2127AT/2Y
designator U?
IC RTC CLK/CAL I2C/SPI 20-SOIC; Solder: SMT; MPN: PCF2127AT/2Y; Value: PCF2127AT/2Y; Category: IC
pins: 1 SCL, 2 SDI, 3 SDO, 4 SDA/~{CE}, 5 IFS, 6 ~{TS}, 7 CLKOUT, 8 VSS, 9 NC, 10 NC, 11 NC, 12 NC, 13 TEST, 14 ~{PFO}, 15 PFI, 16 ~{RST}, 17 ~{INT}, 18 BBS, 19 VBAT, 20 VDD

## PCF8575CRGER
designator U3, comment PCF8575
IC I/O EXPANDER I2C 16B 24VQFN; MPN: PCF8575CRGER; Solder: SMT; Value: PCF8575; Category: IC
footprint 24-VFQFN (VFQFN, 24-lead, Body 4x4 mm, 0.5 mm pitch,IPC High Density)
pins: 1 P00 (io), 2 P01 (io), 3 P02 (io), 4 P03 (io), 5 P04 (io), 6 P05 (io), 7 P06 (io), 8 P07 (io), 9 GND (power), 10 P10 (io), 11 P11 (io), 12 P12 (io), 13 P13 (io), 14 P14 (io), 15 P15 (io), 16 P16 (io), 17 P17 (io), 18 A0 (in), 19 SCL (in), 20 SDA (io), 21 VCC (power), 22 INT (out), 23 A1 (in), 24 A2 (in), 25 EPAD (power)

## PCM1794ADBR
designator U?
IC DAC AUDIO 24BIT 192KHZ 28SSOP; MFR: Texas Instruments; Solder: SMT; MPN: PCM1794ADBR; Category: IC; Value: PCM1794ADBR
footprint DB28
part A pins: 1 MONO (in), 2 CHSL (in), 3 DEM (in), 4 LRCK (in), 5 DATA (in), 6 BCK (in), 7 SCK (in), 10 MUTE (in), 11 FMT0 (in), 12 FMT1 (in), 13 ZERO (out), 14 *RST (in), 17 IOUTR+ (out), 18 IOUTR- (out), 25 IOUTL+ (out), 26 IOUTL- (out)
part B pins: 8 DGND (power), 9 VDD (power), 15 VCC2R (power), 16 AGND3R (power), 19 AGND1 (power), 20 IREF (power), 21 VCOMR (power), 22 VCOML (power), 23 VCC1 (power), 24 AGND2 (power), 27 AGND3L (power), 28 VCC2L (power)